# Altium footprint library ref-packages.PCBLIB: 1543 footprints (part 5 of 103)
Each footprint in its own frame and in the unit in brackets; x right, y up, seen from the top. Pads: shape width x height; smd on the part's side, far side on the other; paste and mask are expansions set on the pad; w line width, h text height; cw(c..) or ccw(c..) is an arc to the next point about the centre after c.
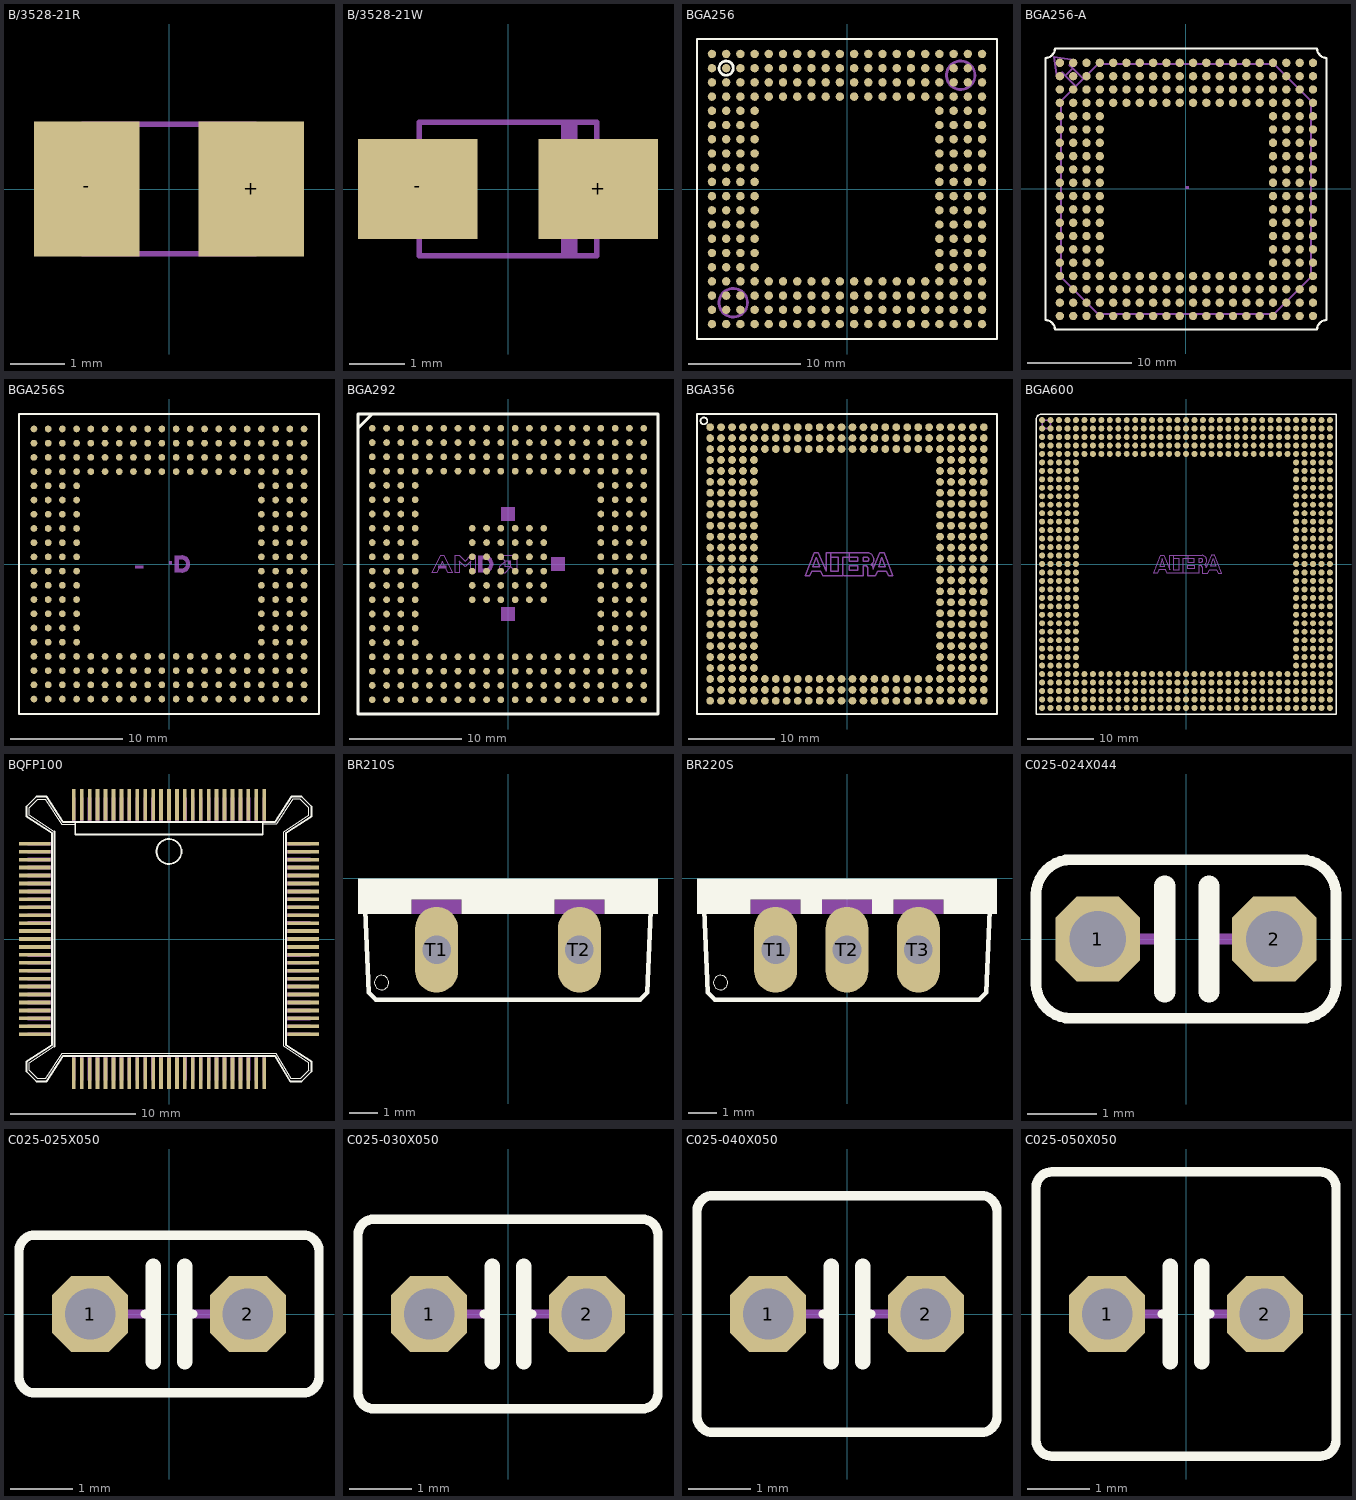
[diagram p4: the footprints below, top view; thin cyan lines are the x and y axes]

## B/3528-21R [mm]
pads (2):
  rect 1.95x2.5 smd: +(1.525,0) -(-1.525,0)
Mechanical 16:
  rectangle: -1.75,-0.6 -1.625,0.6
  rectangle: 1.625,-0.6 1.75,0.6
  rectangle: 0.95,-1.225 1.25,1.225
  lines w0.102: -1.6,-1.2 1.6,-1.2 1.6,1.2 -1.6,1.2 -1.6,-1.2

## B/3528-21W [mil]
pads (2):
  rect 84.65x70.87 smd: +(63.98,0) -(-63.98,0)
Mechanical 16:
  rectangle: -68.9,-23.62 -63.98,23.62
  rectangle: 63.98,-23.62 68.9,23.62
  rectangle: 37.4,-48.23 49.21,48.23
  lines w4: -62.99,-47.24 62.99,-47.24 62.99,47.24 -62.99,47.24 -62.99,-47.24

## BGA256 [mil]
pads (256):
  rrect100% 29.53x29.53 smd: A1(-475,475) A2(-425,475) A3(-375,475) A4(-325,475) A5(-275,475) A6(-225,475) A7(-175,475) A8(-125,475) A9(-75,475) A10(-25,475) A11(25,475) A12(75,475) A13(125,475) A14(175,475) A15(225,475) A16(275,475) A17(325,475) A18(375,475) A19(425,475) A20(475,475) B1(-475,425) B2(-425,425) B3(-375,425) B4(-325,425) B5(-275,425) B6(-225,425) B7(-175,425) B8(-125,425) B9(-75,425) B10(-25,425) B11(25,425) B12(75,425) B13(125,425) B14(175,425) B15(225,425) B16(275,425) B17(325,425) B18(375,425) B19(425,425) B20(475,425) C1(-475,375) C2(-425,375) C3(-375,375) C4(-325,375) C5(-275,375) C6(-225,375) C7(-175,375) C8(-125,375) C9(-75,375) C10(-25,375) C11(25,375) C12(75,375) C13(125,375) C14(175,375) C15(225,375) C16(275,375) C17(325,375) C18(375,375) C19(425,375) C20(475,375) D1(-475,325) D2(-425,325) D3(-375,325) D4(-325,325) D5(-275,325) D6(-225,325) D7(-175,325) D8(-125,325) D9(-75,325) D10(-25,325) D11(25,325) D12(75,325) D13(125,325) D14(175,325) D15(225,325) D16(275,325) D17(325,325) D18(375,325) D19(425,325) D20(475,325) E1(-475,275) E2(-425,275) E3(-375,275) E4(-325,275) E17(325,275) E18(375,275) E19(425,275) E20(475,275) F1(-475,225) F2(-425,225) F3(-375,225) F4(-325,225) F17(325,225) F18(375,225) F19(425,225) F20(475,225) G1(-475,175) G2(-425,175) G3(-375,175) G4(-325,175) G17(325,175) G18(375,175) G19(425,175) G20(475,175) H1(-475,125) H2(-425,125) H3(-375,125) H4(-325,125) H17(325,125) H18(375,125) H19(425,125) H20(475,125) J1(-475,75) J2(-425,75) J3(-375,75) J4(-325,75) J17(325,75) J18(375,75) J19(425,75) J20(475,75) K1(-475,25) K2(-425,25) K3(-375,25) K4(-325,25) K17(325,25) K18(375,25) K19(425,25) K20(475,25) L1(-475,-25) L2(-425,-25) L3(-375,-25) L4(-325,-25) L17(325,-25) L18(375,-25) L19(425,-25) L20(475,-25) M1(-475,-75) M2(-425,-75) M3(-375,-75) M4(-325,-75) M17(325,-75) M18(375,-75) M19(425,-75) M20(475,-75) N1(-475,-125) N2(-425,-125) N3(-375,-125) N4(-325,-125) N17(325,-125) N18(375,-125) N19(425,-125) N20(475,-125) P1(-475,-175) P2(-425,-175) P3(-375,-175) P4(-325,-175) P17(325,-175) P18(375,-175) P19(425,-175) P20(475,-175) R1(-475,-225) R2(-425,-225) R3(-375,-225) R4(-325,-225) R17(325,-225) R18(375,-225) R19(425,-225) R20(475,-225) T1(-475,-275) T2(-425,-275) T3(-375,-275) T4(-325,-275) T17(325,-275) T18(375,-275) T19(425,-275) T20(475,-275) U1(-475,-325) U2(-425,-325) U3(-375,-325) U4(-325,-325) U5(-275,-325) U6(-225,-325) U7(-175,-325) U8(-125,-325) U9(-75,-325) U10(-25,-325) U11(25,-325) U12(75,-325) U13(125,-325) U14(175,-325) U15(225,-325) U16(275,-325) U17(325,-325) U18(375,-325) U19(425,-325) U20(475,-325) V1(-475,-375) V2(-425,-375) V3(-375,-375) V4(-325,-375) V5(-275,-375) V6(-225,-375) V7(-175,-375) V8(-125,-375) V9(-75,-375) V10(-25,-375) V11(25,-375) V12(75,-375) V13(125,-375) V14(175,-375) V15(225,-375) V16(275,-375) V17(325,-375) V18(375,-375) V19(425,-375) V20(475,-375) W1(-475,-425) W2(-425,-425) W3(-375,-425) W4(-325,-425) W5(-275,-425) W6(-225,-425) W7(-175,-425) W8(-125,-425) W9(-75,-425) W10(-25,-425) W11(25,-425) W12(75,-425) W13(125,-425) W14(175,-425) W15(225,-425) W16(275,-425) W17(325,-425) W18(375,-425) W19(425,-425) W20(475,-425) Y1(-475,-475) Y2(-425,-475) Y3(-375,-475) Y4(-325,-475) Y5(-275,-475) Y6(-225,-475) Y7(-175,-475) Y8(-125,-475) Y9(-75,-475) Y10(-25,-475) Y11(25,-475) Y12(75,-475) Y13(125,-475) Y14(175,-475) Y15(225,-475) Y16(275,-475) Y17(325,-475) Y18(375,-475) Y19(425,-475) Y20(475,-475)
Top Overlay:
  circle w10: c-425,425 r25
  lines w8: -527.56,-527.13 -527.56,527.13 ; -527.13,-527.56 527.13,-527.56 ; -527.13,527.56 527.13,527.56 ; 527.56,-527.13 527.56,527.13
Mechanical 16:
  circle w10: c-400,-400 r50
  circle w10: c400,400 r50

## BGA256-A [mil]
pads (256):
  rrect100% 31.5x31.5 smd: A1(-473.43,473.43) A2(-423.43,473.43) A3(-373.43,473.43) A4(-323.43,473.43) A5(-273.43,473.43) A6(-223.43,473.43) A7(-173.43,473.43) A8(-123.43,473.43) A9(-73.43,473.43) A10(-23.43,473.43) A11(26.57,473.43) A12(76.57,473.43) A13(126.57,473.43) A14(176.57,473.43) A15(226.57,473.43) A16(276.57,473.43) A17(326.57,473.43) A18(376.57,473.43) A19(426.57,473.43) A20(476.57,473.43) B1(-473.43,423.43) B2(-423.43,423.43) B3(-373.43,423.43) B4(-323.43,423.43) B5(-273.43,423.43) B6(-223.43,423.43) B7(-173.43,423.43) B8(-123.43,423.43) B9(-73.43,423.43) B10(-23.43,423.43) B11(26.57,423.43) B12(76.57,423.43) B13(126.57,423.43) B14(176.57,423.43) B15(226.57,423.43) B16(276.57,423.43) B17(326.57,423.43) B18(376.57,423.43) B19(426.57,423.43) B20(476.57,423.43) C1(-473.43,373.43) C2(-423.43,373.43) C3(-373.43,373.43) C4(-323.43,373.43) C5(-273.43,373.43) C6(-223.43,373.43) C7(-173.43,373.43) C8(-123.43,373.43) C9(-73.43,373.43) C10(-23.43,373.43) C11(26.57,373.43) C12(76.57,373.43) C13(126.57,373.43) C14(176.57,373.43) C15(226.57,373.43) C16(276.57,373.43) C17(326.57,373.43) C18(376.57,373.43) C19(426.57,373.43) C20(476.57,373.43) D1(-473.43,323.43) D2(-423.43,323.43) D3(-373.43,323.43) D4(-323.43,323.43) D5(-273.43,323.43) D6(-223.43,323.43) D7(-173.43,323.43) D8(-123.43,323.43) D9(-73.43,323.43) D10(-23.43,323.43) D11(26.57,323.43) D12(76.57,323.43) D13(126.57,323.43) D14(176.57,323.43) D15(226.57,323.43) D16(276.57,323.43) D17(326.57,323.43) D18(376.57,323.43) D19(426.57,323.43) D20(476.57,323.43) E1(-473.43,273.43) E2(-423.43,273.43) E3(-373.43,273.43) E4(-323.43,273.43) E17(326.57,273.43) E18(376.57,273.43) E19(426.57,273.43) E20(476.57,273.43) F1(-473.43,223.43) F2(-423.43,223.43) F3(-373.43,223.43) F4(-323.43,223.43) F17(326.57,223.43) F18(376.57,223.43) F19(426.57,223.43) F20(476.57,223.43) G1(-473.43,173.43) G2(-423.43,173.43) G3(-373.43,173.43) G4(-323.43,173.43) G17(326.57,173.43) G18(376.57,173.43) G19(426.57,173.43) G20(476.57,173.43) H1(-473.43,123.43) H2(-423.43,123.43) H3(-373.43,123.43) H4(-323.43,123.43) H17(326.57,123.43) H18(376.57,123.43) H19(426.57,123.43) H20(476.57,123.43) J1(-473.43,73.43) J2(-423.43,73.43) J3(-373.43,73.43) J4(-323.43,73.43) J17(326.57,73.43) J18(376.57,73.43) J19(426.57,73.43) J20(476.57,73.43) K1(-473.43,23.43) K2(-423.43,23.43) K3(-373.43,23.43) K4(-323.43,23.43) K17(326.57,23.43) K18(376.57,23.43) K19(426.57,23.43) K20(476.57,23.43) L1(-473.43,-26.57) L2(-423.43,-26.57) L3(-373.43,-26.57) L4(-323.43,-26.57) L17(326.57,-26.57) L18(376.57,-26.57) L19(426.57,-26.57) L20(476.57,-26.57) M1(-473.43,-76.57) M2(-423.43,-76.57) M3(-373.43,-76.57) M4(-323.43,-76.57) M17(326.57,-76.57) M18(376.57,-76.57) M19(426.57,-76.57) M20(476.57,-76.57) N1(-473.43,-126.57) N2(-423.43,-126.57) N3(-373.43,-126.57) N4(-323.43,-126.57) N17(326.57,-126.57) N18(376.57,-126.57) N19(426.57,-126.57) N20(476.57,-126.57) P1(-473.43,-176.57) P2(-423.43,-176.57) P3(-373.43,-176.57) P4(-323.43,-176.57) P17(326.57,-176.57) P18(376.57,-176.57) P19(426.57,-176.57) P20(476.57,-176.57) R1(-473.43,-226.57) R2(-423.43,-226.57) R3(-373.43,-226.57) R4(-323.43,-226.57) R17(326.57,-226.57) R18(376.57,-226.57) R19(426.57,-226.57) R20(476.57,-226.57) T1(-473.43,-276.57) T2(-423.43,-276.57) T3(-373.43,-276.57) T4(-323.43,-276.57) T17(326.57,-276.57) T18(376.57,-276.57) T19(426.57,-276.57) T20(476.57,-276.57) U1(-473.43,-326.57) U2(-423.43,-326.57) U3(-373.43,-326.57) U4(-323.43,-326.57) U5(-273.43,-326.57) U6(-223.43,-326.57) U7(-173.43,-326.57) U8(-123.43,-326.57) U9(-73.43,-326.57) U10(-23.43,-326.57) U11(26.57,-326.57) U12(76.57,-326.57) U13(126.57,-326.57) U14(176.57,-326.57) U15(226.57,-326.57) U16(276.57,-326.57) U17(326.57,-326.57) U18(376.57,-326.57) U19(426.57,-326.57) U20(476.57,-326.57) V1(-473.43,-376.57) V2(-423.43,-376.57) V3(-373.43,-376.57) V4(-323.43,-376.57) V5(-273.43,-376.57) V6(-223.43,-376.57) V7(-173.43,-376.57) V8(-123.43,-376.57) V9(-73.43,-376.57) V10(-23.43,-376.57) V11(26.57,-376.57) V12(76.57,-376.57) V13(126.57,-376.57) V14(176.57,-376.57) V15(226.57,-376.57) V16(276.57,-376.57) V17(326.57,-376.57) V18(376.57,-376.57) V19(426.57,-376.57) V20(476.57,-376.57) W1(-473.43,-426.57) W2(-423.43,-426.57) W3(-373.43,-426.57) W4(-323.43,-426.57) W5(-273.43,-426.57) W6(-223.43,-426.57) W7(-173.43,-426.57) W8(-123.43,-426.57) W9(-73.43,-426.57) W10(-23.43,-426.57) W11(26.57,-426.57) W12(76.57,-426.57) W13(126.57,-426.57) W14(176.57,-426.57) W15(226.57,-426.57) W16(276.57,-426.57) W17(326.57,-426.57) W18(376.57,-426.57) W19(426.57,-426.57) W20(476.57,-426.57) Y1(-473.43,-476.57) Y2(-423.43,-476.57) Y3(-373.43,-476.57) Y4(-323.43,-476.57) Y5(-273.43,-476.57) Y6(-223.43,-476.57) Y7(-173.43,-476.57) Y8(-123.43,-476.57) Y9(-73.43,-476.57) Y10(-23.43,-476.57) Y11(26.57,-476.57) Y12(76.57,-476.57) Y13(126.57,-476.57) Y14(176.57,-476.57) Y15(226.57,-476.57) Y16(276.57,-476.57) Y17(326.57,-476.57) Y18(376.57,-476.57) Y19(426.57,-476.57) Y20(476.57,-476.57)
Top Overlay:
  lines w8: -527.56,-492.13 -527.56,492.13 ccw(c-527.56,527.56) -492.13,527.56 492.13,527.56 ccw(c527.56,527.56) 527.56,492.13 527.56,-492.13 ccw(c527.56,-527.56) 492.13,-527.56 -492.13,-527.56 ccw(c-527.56,-527.56) -527.56,-492.13
Mechanical 16:
  region: 0,0 10,0 10,10 0,10
  region: 0,0 10,0 10,10 0,10
  lines w8: -452.76,425.2 -464.57,437.01 -484.25,417.32 -496.06,496.06 -417.32,484.25 -437.01,464.57 -425.2,452.76 ; -452.76,425.2 -413.39,385.83 ; -452.76,425.2 -425.2,452.76 ; -425.2,452.76 -385.83,413.39 ; -413.39,385.83 -468.5,330.71 -468.5,-330.71 -330.71,-468.5 330.71,-468.5 468.5,-330.71 468.5,330.71 330.71,468.5 -330.71,468.5 -385.83,413.39 ; -413.39,385.83 -385.83,413.39

## BGA256S [mil]
pads (256):
  rrect100% 23.62x23.62 smd: A1(-475,475) A2(-425,475) A3(-375,475) A4(-325,475) A5(-275,475) A6(-225,475) A7(-175,475) A8(-125,475) A9(-75,475) A10(-25,475) A11(25,475) A12(75,475) A13(125,475) A14(175,475) A15(225,475) A16(275,475) A17(325,475) A18(375,475) A19(425,475) A20(475,475) B1(-475,425) B2(-425,425) B3(-375,425) B4(-325,425) B5(-275,425) B6(-225,425) B7(-175,425) B8(-125,425) B9(-75,425) B10(-25,425) B11(25,425) B12(75,425) B13(125,425) B14(175,425) B15(225,425) B16(275,425) B17(325,425) B18(375,425) B19(425,425) B20(475,425) C1(-475,375) C2(-425,375) C3(-375,375) C4(-325,375) C5(-275,375) C6(-225,375) C7(-175,375) C8(-125,375) C9(-75,375) C10(-25,375) C11(25,375) C12(75,375) C13(125,375) C14(175,375) C15(225,375) C16(275,375) C17(325,375) C18(375,375) C19(425,375) C20(475,375) D1(-475,325) D2(-425,325) D3(-375,325) D4(-325,325) D5(-275,325) D6(-225,325) D7(-175,325) D8(-125,325) D9(-75,325) D10(-25,325) D11(25,325) D12(75,325) D13(125,325) D14(175,325) D15(225,325) D16(275,325) D17(325,325) D18(375,325) D19(425,325) D20(475,325) E1(-475,275) E2(-425,275) E3(-375,275) E4(-325,275) E17(325,275) E18(375,275) E19(425,275) E20(475,275) F1(-475,225) F2(-425,225) F3(-375,225) F4(-325,225) F17(325,225) F18(375,225) F19(425,225) F20(475,225) G1(-475,175) G2(-425,175) G3(-375,175) G4(-325,175) G17(325,175) G18(375,175) G19(425,175) G20(475,175) H1(-475,125) H2(-425,125) H3(-375,125) H4(-325,125) H17(325,125) H18(375,125) H19(425,125) H20(475,125) J1(-475,75) J2(-425,75) J3(-375,75) J4(-325,75) J17(325,75) J18(375,75) J19(425,75) J20(475,75) K1(-475,25) K2(-425,25) K3(-375,25) K4(-325,25) K17(325,25) K18(375,25) K19(425,25) K20(475,25) L1(-475,-25) L2(-425,-25) L3(-375,-25) L4(-325,-25) L17(325,-25) L18(375,-25) L19(425,-25) L20(475,-25) M1(-475,-75) M2(-425,-75) M3(-375,-75) M4(-325,-75) M17(325,-75) M18(375,-75) M19(425,-75) M20(475,-75) N1(-475,-125) N2(-425,-125) N3(-375,-125) N4(-325,-125) N17(325,-125) N18(375,-125) N19(425,-125) N20(475,-125) P1(-475,-175) P2(-425,-175) P3(-375,-175) P4(-325,-175) P17(325,-175) P18(375,-175) P19(425,-175) P20(475,-175) R1(-475,-225) R2(-425,-225) R3(-375,-225) R4(-325,-225) R17(325,-225) R18(375,-225) R19(425,-225) R20(475,-225) T1(-475,-275) T2(-425,-275) T3(-375,-275) T4(-325,-275) T17(325,-275) T18(375,-275) T19(425,-275) T20(475,-275) U1(-475,-325) U2(-425,-325) U3(-375,-325) U4(-325,-325) U5(-275,-325) U6(-225,-325) U7(-175,-325) U8(-125,-325) U9(-75,-325) U10(-25,-325) U11(25,-325) U12(75,-325) U13(125,-325) U14(175,-325) U15(225,-325) U16(275,-325) U17(325,-325) U18(375,-325) U19(425,-325) U20(475,-325) V1(-475,-375) V2(-425,-375) V3(-375,-375) V4(-325,-375) V5(-275,-375) V6(-225,-375) V7(-175,-375) V8(-125,-375) V9(-75,-375) V10(-25,-375) V11(25,-375) V12(75,-375) V13(125,-375) V14(175,-375) V15(225,-375) V16(275,-375) V17(325,-375) V18(375,-375) V19(425,-375) V20(475,-375) W1(-475,-425) W2(-425,-425) W3(-375,-425) W4(-325,-425) W5(-275,-425) W6(-225,-425) W7(-175,-425) W8(-125,-425) W9(-75,-425) W10(-25,-425) W11(25,-425) W12(75,-425) W13(125,-425) W14(175,-425) W15(225,-425) W16(275,-425) W17(325,-425) W18(375,-425) W19(425,-425) W20(475,-425) Y1(-475,-475) Y2(-425,-475) Y3(-375,-475) Y4(-325,-475) Y5(-275,-475) Y6(-225,-475) Y7(-175,-475) Y8(-125,-475) Y9(-75,-475) Y10(-25,-475) Y11(25,-475) Y12(75,-475) Y13(125,-475) Y14(175,-475) Y15(225,-475) Y16(275,-475) Y17(325,-475) Y18(375,-475) Y19(425,-475) Y20(475,-475)
Top Overlay:
  lines w8: -527.56,-527.13 -527.56,527.13 ; -527.13,-527.56 527.13,-527.56 ; -527.13,527.56 527.13,527.56 ; 527.56,-527.13 527.56,527.13
Mechanical 16:
  rectangle: 23,16 45,30
  rectangle: 23,-30 45,-16
  rectangle: -120,-15 -90,-5
  rectangle: 20,-30 35,30
  region: 0,0 10,0 10,10 0,10
  region: 0,0 10,0 10,10 0,10
  region: 0,0 10,0 10,10 0,10
  region: 0,0 10,0 10,10 0,10
  region: 0,0 10,0 10,10 0,10
  lines w2: 44,-29 ccw(c44,0) 44,29
  lines w8: 44,-25 ccw(c44,0) 44,25
  lines w10: 44,-21 ccw(c44,0) 44,21
  text "BGA256" at -185.63,-103.74 h49.6

## BGA292 [mil]
pads (292):
  rrect100% 23.62x23.62 smd: A01(-475,475) A02(-425,475) A03(-375,475) A04(-325,475) A05(-275,475) A06(-225,475) A07(-175,475) A08(-125,475) A09(-75,475) A10(-25,475) A11(25,475) A12(75,475) A13(125,475) A14(175,475) A15(225,475) A16(275,475) A17(325,475) A18(375,475) A19(425,475) A20(475,475) B01(-475,425) B02(-425,425) B03(-375,425) B04(-325,425) B05(-275,425) B06(-225,425) B07(-175,425) B08(-125,425) B09(-75,425) B10(-25,425) B11(25,425) B12(75,425) B13(125,425) B14(175,425) B15(225,425) B16(275,425) B17(325,425) B18(375,425) B19(425,425) B20(475,425) C01(-475,375) C02(-425,375) C03(-375,375) C04(-325,375) C05(-275,375) C06(-225,375) C07(-175,375) C08(-125,375) C09(-75,375) C10(-25,375) C11(25,375) C12(75,375) C13(125,375) C14(175,375) C15(225,375) C16(275,375) C17(325,375) C18(375,375) C19(425,375) C20(475,375) D01(-475,325) D02(-425,325) D03(-375,325) D04(-325,325) D05(-275,325) D06(-225,325) D07(-175,325) D08(-125,325) D09(-75,325) D10(-25,325) D11(25,325) D12(75,325) D13(125,325) D14(175,325) D15(225,325) D16(275,325) D17(325,325) D18(375,325) D19(425,325) D20(475,325) E01(-475,275) E02(-425,275) E03(-375,275) E04(-325,275) E17(325,275) E18(375,275) E19(425,275) E20(475,275) F01(-475,225) F02(-425,225) F03(-375,225) F04(-325,225) F17(325,225) F18(375,225) F19(425,225) F20(475,225) G01(-475,175) G02(-425,175) G03(-375,175) G04(-325,175) G17(325,175) G18(375,175) G19(425,175) G20(475,175) H01(-475,125) H02(-425,125) H03(-375,125) H04(-325,125) H08(-125,125) H09(-75,125) H10(-25,125) H11(25,125) H12(75,125) H13(125,125) H17(325,125) H18(375,125) H19(425,125) H20(475,125) J01(-475,75) J02(-425,75) J03(-375,75) J04(-325,75) J08(-125,75) J09(-75,75) J10(-25,75) J11(25,75) J12(75,75) J13(125,75) J17(325,75) J18(375,75) J19(425,75) J20(475,75) K01(-475,25) K02(-425,25) K03(-375,25) K04(-325,25) K08(-125,25) K09(-75,25) K10(-25,25) K11(25,25) K12(75,25) K13(125,25) K17(325,25) K18(375,25) K19(425,25) K20(475,25) L01(-475,-25) L02(-425,-25) L03(-375,-25) L04(-325,-25) L08(-125,-25) L09(-75,-25) L10(-25,-25) L11(25,-25) L12(75,-25) L13(125,-25) L17(325,-25) L18(375,-25) L19(425,-25) L20(475,-25) M01(-475,-75) M02(-425,-75) M03(-375,-75) M04(-325,-75) M08(-125,-75) M09(-75,-75) M10(-25,-75) M11(25,-75) M12(75,-75) M13(125,-75) M17(325,-75) M18(375,-75) M19(425,-75) M20(475,-75) N01(-475,-125) N02(-425,-125) N03(-375,-125) N04(-325,-125) N08(-125,-125) N09(-75,-125) N10(-25,-125) N11(25,-125) N12(75,-125) N13(125,-125) N17(325,-125) N18(375,-125) N19(425,-125) N20(475,-125) P01(-475,-175) P02(-425,-175) P03(-375,-175) P04(-325,-175) P17(325,-175) P18(375,-175) P19(425,-175) P20(475,-175) R01(-475,-225) R02(-425,-225) R03(-375,-225) R04(-325,-225) R17(325,-225) R18(375,-225) R19(425,-225) R20(475,-225) T01(-475,-275) T02(-425,-275) T03(-375,-275) T04(-325,-275) T17(325,-275) T18(375,-275) T19(425,-275) T20(475,-275) U01(-475,-325) U02(-425,-325) U03(-375,-325) U04(-325,-325) U05(-275,-325) U06(-225,-325) U07(-175,-325) U08(-125,-325) U09(-75,-325) U10(-25,-325) U11(25,-325) U12(75,-325) U13(125,-325) U14(175,-325) U15(225,-325) U16(275,-325) U17(325,-325) U18(375,-325) U19(425,-325) U20(475,-325) V01(-475,-375) V02(-425,-375) V03(-375,-375) V04(-325,-375) V05(-275,-375) V06(-225,-375) V07(-175,-375) V08(-125,-375) V09(-75,-375) V10(-25,-375) V11(25,-375) V12(75,-375) V13(125,-375) V14(175,-375) V15(225,-375) V16(275,-375) V17(325,-375) V18(375,-375) V19(425,-375) V20(475,-375) W01(-475,-425) W02(-425,-425) W03(-375,-425) W04(-325,-425) W05(-275,-425) W06(-225,-425) W07(-175,-425) W08(-125,-425) W09(-75,-425) W10(-25,-425) W11(25,-425) W12(75,-425) W13(125,-425) W14(175,-425) W15(225,-425) W16(275,-425) W17(325,-425) W18(375,-425) W19(425,-425) W20(475,-425) Y01(-475,-475) Y02(-425,-475) Y03(-375,-475) Y04(-325,-475) Y05(-275,-475) Y06(-225,-475) Y07(-175,-475) Y08(-125,-475) Y09(-75,-475) Y10(-25,-475) Y11(25,-475) Y12(75,-475) Y13(125,-475) Y14(175,-475) Y15(225,-475) Y16(275,-475) Y17(325,-475) Y18(375,-475) Y19(425,-475) Y20(475,-475)
Top Overlay:
  lines w10: -525,475 -525,-525 525,-525 525,525 -475,525 ; -525,475 -525,525 -475,525 ; -525,475 -475,525
Mechanical 16:
  rectangle: -25,150 25,200
  rectangle: -25,-200 25,-150
  rectangle: 150,-25 200,25
  rectangle: -102,16 -80,30
  rectangle: -102,-30 -80,-16
  rectangle: -245,-15 -215,-5
  rectangle: -105,-30 -90,30
  region: 0,0 10,0 10,10 0,10
  region: 0,0 10,0 10,10 0,10
  region: 0,0 10,0 10,10 0,10
  region: 0,0 10,0 10,10 0,10
  lines w2: -81,-29 ccw(c-81,0) -81,29 ; -10,10 10,10 10,-10 ; -10,10 -30,30 30,30 30,-30 10,-10 ; -10,10 -30,-10 -30,-30 -10,-30 10,-10 ; -10,10 -10,-10 10,-10 ; -265,-30 -235,30 -225,30 -195,-30 -210,-30 -230,10 -250,-30 -265,-30 ; -185,-30 -185,30 -170,30 -150,10 -130,30 -115,30 -115,-30 -130,-30 -130,10 -150,-10 -170,10 -170,-30 -185,-30
  lines w8: -81,-25 ccw(c-81,0) -81,25
  lines w10: -81,-21 ccw(c-81,0) -81,21
  text "1" at -475,500 h24.8
  text "2" at -425,500 h24.8
  text "3" at -375,500 h24.8
  text "4" at -325,500 h24.8
  text "5" at -275,500 h24.8
  text "6" at -225,500 h24.8
  text "7" at -175,500 h24.8
  text "8" at -125,500 h24.8
  text "9" at -75,500 h24.8
  text "10" at -25,500 h24.8
  text "11" at 25,500 h24.8
  text "12" at 75,500 h24.8
  text "13" at 125,500 h24.8
  text "14" at 175,500 h24.8
  text "15" at 225,500 h24.8
  text "16" at 275,500 h24.8
  text "17" at 325,500 h24.8
  text "18" at 375,500 h24.8
  text "19" at 425,500 h24.8
  text "20" at 475,500 h24.8
  text "A" at -510,470 h24.8
  text "B" at -510,420 h24.8
  text "C" at -510,370 h24.8
  text "D" at -510,320 h24.8
  text "E" at -510,270 h24.8
  text "F" at -510,220 h24.8
  text "G" at -510,170 h24.8
  text "H" at -510,120 h24.8
  text "J" at -510,70 h24.8
  text "K" at -510,20 h24.8
  text "L" at -510,-30 h24.8
  text "M" at -510,-80 h24.8
  text "N" at -510,-130 h24.8
  text "P" at -510,-180 h24.8
  text "R" at -510,-230 h24.8
  text "T" at -510,-280 h24.8
  text "U" at -510,-330 h24.8
  text "V" at -510,-380 h24.8
  text "W" at -510,-430 h24.8
  text "Y" at -510,-480 h24.8

## BGA356 [mil]
pads (356):
  rrect100% 35.43x35.43 smd: A1(-625,625) A2(-575,625) A3(-525,625) A4(-475,625) A5(-425,625) A6(-375,625) A7(-325,625) A8(-275,625) A9(-225,625) A10(-175,625) A11(-125,625) A12(-75,625) A13(-25,625) A14(25,625) A15(75,625) A16(125,625) A17(175,625) A18(225,625) A19(275,625) A20(325,625) A21(375,625) A22(425,625) A23(475,625) A24(525,625) A25(575,625) A26(625,625) AA1(-625,-375) AA2(-575,-375) AA3(-525,-375) AA4(-475,-375) AA5(-425,-375) AA22(425,-375) AA23(475,-375) AA24(525,-375) AA25(575,-375) AA26(625,-375) AB1(-625,-425) AB2(-575,-425) AB3(-525,-425) AB4(-475,-425) AB5(-425,-425) AB22(425,-425) AB23(475,-425) AB24(525,-425) AB25(575,-425) AB26(625,-425) AC1(-625,-475) AC2(-575,-475) AC3(-525,-475) AC4(-475,-475) AC5(-425,-475) AC22(425,-475) AC23(475,-475) AC24(525,-475) AC25(575,-475) AC26(625,-475) AD1(-625,-525) AD2(-575,-525) AD3(-525,-525) AD4(-475,-525) AD5(-425,-525) AD6(-375,-525) AD7(-325,-525) AD8(-275,-525) AD9(-225,-525) AD10(-175,-525) AD11(-125,-525) AD12(-75,-525) AD13(-25,-525) AD14(25,-525) AD15(75,-525) AD16(125,-525) AD17(175,-525) AD18(225,-525) AD19(275,-525) AD20(325,-525) AD21(375,-525) AD22(425,-525) AD23(475,-525) AD24(525,-525) AD25(575,-525) AD26(625,-525) AE1(-625,-575) AE2(-575,-575) AE3(-525,-575) AE4(-475,-575) AE5(-425,-575) AE6(-375,-575) AE7(-325,-575) AE8(-275,-575) AE9(-225,-575) AE10(-175,-575) AE11(-125,-575) AE12(-75,-575) AE13(-25,-575) AE14(25,-575) AE15(75,-575) AE16(125,-575) AE17(175,-575) AE18(225,-575) AE19(275,-575) AE20(325,-575) AE21(375,-575) AE22(425,-575) AE23(475,-575) AE24(525,-575) AE25(575,-575) AE26(625,-575) AF1(-625,-625) AF2(-575,-625) AF3(-525,-625) AF4(-475,-625) AF5(-425,-625) AF6(-375,-625) AF7(-325,-625) AF8(-275,-625) AF9(-225,-625) AF10(-175,-625) AF11(-125,-625) AF12(-75,-625) AF13(-25,-625) AF14(25,-625) AF15(75,-625) AF16(125,-625) AF17(175,-625) AF18(225,-625) AF19(275,-625) AF20(325,-625) AF21(375,-625) AF22(425,-625) AF23(475,-625) AF24(525,-625) AF25(575,-625) AF26(625,-625) B1(-625,575) B2(-575,575) B3(-525,575) B4(-475,575) B5(-425,575) B6(-375,575) B7(-325,575) B8(-275,575) B9(-225,575) B10(-175,575) B11(-125,575) B12(-75,575) B13(-25,575) B14(25,575) B15(75,575) B16(125,575) B17(175,575) B18(225,575) B19(275,575) B20(325,575) B21(375,575) B22(425,575) B23(475,575) B24(525,575) B25(575,575) B26(625,575) C1(-625,525) C2(-575,525) C3(-525,525) C4(-475,525) C5(-425,525) C6(-375,525) C7(-325,525) C8(-275,525) C9(-225,525) C10(-175,525) C11(-125,525) C12(-75,525) C13(-25,525) C14(25,525) C15(75,525) C16(125,525) C17(175,525) C18(225,525) C19(275,525) C20(325,525) C21(375,525) C22(425,525) C23(475,525) C24(525,525) C25(575,525) C26(625,525) D1(-625,475) D2(-575,475) D3(-525,475) D4(-475,475) D5(-425,475) D22(425,475) D23(475,475) D24(525,475) D25(575,475) D26(625,475) E1(-625,425) E2(-575,425) E3(-525,425) E4(-475,425) E5(-425,425) E22(425,425) E23(475,425) E24(525,425) E25(575,425) E26(625,425) F1(-625,375) F2(-575,375) F3(-525,375) F4(-475,375) F5(-425,375) F22(425,375) F23(475,375) F24(525,375) F25(575,375) F26(625,375) G1(-625,325) G2(-575,325) G3(-525,325) G4(-475,325) G5(-425,325) G22(425,325) G23(475,325) G24(525,325) G25(575,325) G26(625,325) H1(-625,275) H2(-575,275) H3(-525,275) H4(-475,275) H5(-425,275) H22(425,275) H23(475,275) H24(525,275) H25(575,275) H26(625,275) J1(-625,225) J2(-575,225) J3(-525,225) J4(-475,225) J5(-425,225) J22(425,225) J23(475,225) J24(525,225) J25(575,225) J26(625,225) K1(-625,175) K2(-575,175) K3(-525,175) K4(-475,175) K5(-425,175) K22(425,175) K23(475,175) K24(525,175) K25(575,175) K26(625,175) L1(-625,125) L2(-575,125) L3(-525,125) L4(-475,125) L5(-425,125) L22(425,125) L23(475,125) L24(525,125) L25(575,125) L26(625,125) M1(-625,75) M2(-575,75) M3(-525,75) M4(-475,75) M5(-425,75) M22(425,75) M23(475,75) M24(525,75) M25(575,75) M26(625,75) N1(-625,25) N2(-575,25) N3(-525,25) N4(-475,25) N5(-425,25) N22(425,25) N23(475,25) N24(525,25) N25(575,25) N26(625,25) P1(-625,-25) P2(-575,-25) P3(-525,-25) P4(-475,-25) P5(-425,-25) P22(425,-25) P23(475,-25) P24(525,-25) P25(575,-25) P26(625,-25) R1(-625,-75) R2(-575,-75) R3(-525,-75) R4(-475,-75) R5(-425,-75) R22(425,-75) R23(475,-75) R24(525,-75) R25(575,-75) R26(625,-75) T1(-625,-125) T2(-575,-125) T3(-525,-125) T4(-475,-125) T5(-425,-125) T22(425,-125) T23(475,-125) T24(525,-125) T25(575,-125) T26(625,-125) U1(-625,-175) U2(-575,-175) U3(-525,-175) U4(-475,-175) U5(-425,-175) U22(425,-175) U23(475,-175) U24(525,-175) U25(575,-175) U26(625,-175) V1(-625,-225) V2(-575,-225) V3(-525,-225) V4(-475,-225) V5(-425,-225) V22(425,-225) V23(475,-225) V24(525,-225) V25(575,-225) V26(625,-225) W1(-625,-275) W2(-575,-275) W3(-525,-275) W4(-475,-275) W5(-425,-275) W22(425,-275) W23(475,-275) W24(525,-275) W25(575,-275) W26(625,-275) Y1(-625,-325) Y2(-575,-325) Y3(-525,-325) Y4(-475,-325) Y5(-425,-325) Y22(425,-325) Y23(475,-325) Y24(525,-325) Y25(575,-325) Y26(625,-325)
Top Overlay:
  circle w8: c-653.54,653.54 r15.74
  lines w8: -685.04,-685.04 -685.04,685.04 685.04,685.04 685.04,-685.04 -685.04,-685.04
Mechanical 16:
  lines w6: -15.32,-53.43 74.69,-53.43 74.69,-8.43 84.69,-8.43 cw(c84.69,-18.43) 94.69,-18.43 94.69,-53.43 129.69,-53.43 139.69,-33.43 179.69,-33.43 189.69,-53.43 209.69,-53.43 169.69,51.57 149.69,51.57 119.69,-18.43 ; 119.68,-23.43 ccw(c102.19,-19.67) 109.69,-3.43 ccw(c92.19,21.34) 94.69,51.57 9.69,51.57 ; -75.32,31.57 -75.32,51.57 ; -75.32,31.57 -75.32,-33.43 -40.32,-33.43 -40.32,31.57 -75.32,31.57 ; -75.32,51.57 -95.32,51.57 -95.32,-33.43 -130.32,51.57 -150.32,51.57 -190.32,-53.43 -170.32,-53.43 -160.32,-33.43 -120.32,-33.43 -110.32,-53.43 -20.32,-53.43 -20.32,31.57 9.69,31.57 ; -75.32,51.57 9.69,51.57 ; 9.69,31.57 9.69,51.57 ; 9.69,31.57 9.69,11.57 49.69,11.57 49.69,31.57 9.69,31.57 ; -155.32,-13.43 -140.32,31.57 -125.32,-13.43 -155.32,-13.43 ; 9.69,-28.43 49.69,-28.43 49.69,-8.43 9.69,-8.43 9.69,-28.43 ; 74.69,11.57 74.69,31.57 89.69,31.57 cw(c89.69,21.57) 89.69,11.57 74.69,11.57 ; 144.69,-13.43 174.69,-13.43 159.69,31.57 144.69,-13.43
  text "BGA356" at -35.63,-403.74 h49.6

## BGA600 [mil]
pads (600):
  rrect100% 35.43x35.43 smd: A1(-850,850) A2(-800,850) A3(-750,850) A4(-700,850) A5(-650,850) A6(-600,850) A7(-550,850) A8(-500,850) A9(-450,850) A10(-400,850) A11(-350,850) A12(-300,850) A13(-250,850) A14(-200,850) A15(-150,850) A16(-100,850) A17(-50,850) A18(0,850) A19(50,850) A20(100,850) A21(150,850) A22(200,850) A23(250,850) A24(300,850) A25(350,850) A26(400,850) A27(450,850) A28(500,850) A29(550,850) A30(600,850) A31(650,850) A32(700,850) A33(750,850) A34(800,850) A35(850,850) AA1(-850,-150) AA2(-800,-150) AA3(-750,-150) AA4(-700,-150) AA5(-650,-150) AA31(650,-150) AA32(700,-150) AA33(750,-150) AA34(800,-150) AA35(850,-150) AB1(-850,-200) AB2(-800,-200) AB3(-750,-200) AB4(-700,-200) AB5(-650,-200) AB31(650,-200) AB32(700,-200) AB33(750,-200) AB34(800,-200) AB35(850,-200) AC1(-850,-250) AC2(-800,-250) AC3(-750,-250) AC4(-700,-250) AC5(-650,-250) AC31(650,-250) AC32(700,-250) AC33(750,-250) AC34(800,-250) AC35(850,-250) AD1(-850,-300) AD2(-800,-300) AD3(-750,-300) AD4(-700,-300) AD5(-650,-300) AD31(650,-300) AD32(700,-300) AD33(750,-300) AD34(800,-300) AD35(850,-300) AE1(-850,-350) AE2(-800,-350) AE3(-750,-350) AE4(-700,-350) AE5(-650,-350) AE31(650,-350) AE32(700,-350) AE33(750,-350) AE34(800,-350) AE35(850,-350) AF1(-850,-400) AF2(-800,-400) AF3(-750,-400) AF4(-700,-400) AF5(-650,-400) AF31(650,-400) AF32(700,-400) AF33(750,-400) AF34(800,-400) AF35(850,-400) AG1(-850,-450) AG2(-800,-450) AG3(-750,-450) AG4(-700,-450) AG5(-650,-450) AG31(650,-450) AG32(700,-450) AG33(750,-450) AG34(800,-450) AG35(850,-450) AH1(-850,-500) AH2(-800,-500) AH3(-750,-500) AH4(-700,-500) AH5(-650,-500) AH31(650,-500) AH32(700,-500) AH33(750,-500) AH34(800,-500) AH35(850,-500) AJ1(-850,-550) AJ2(-800,-550) AJ3(-750,-550) AJ4(-700,-550) AJ5(-650,-550) AJ31(650,-550) AJ32(700,-550) AJ33(750,-550) AJ34(800,-550) AJ35(850,-550) AK1(-850,-600) AK2(-800,-600) AK3(-750,-600) AK4(-700,-600) AK5(-650,-600) AK31(650,-600) AK32(700,-600) AK33(750,-600) AK34(800,-600) AK35(850,-600) AL1(-850,-650) AL2(-800,-650) AL3(-750,-650) AL4(-700,-650) AL5(-650,-650) AL6(-600,-650) AL7(-550,-650) AL8(-500,-650) AL9(-450,-650) AL10(-400,-650) AL11(-350,-650) AL12(-300,-650) AL13(-250,-650) AL14(-200,-650) AL15(-150,-650) AL16(-100,-650) AL17(-50,-650) AL18(0,-650) AL19(50,-650) AL20(100,-650) AL21(150,-650) AL22(200,-650) AL23(250,-650) AL24(300,-650) AL25(350,-650) AL26(400,-650) AL27(450,-650) AL28(500,-650) AL29(550,-650) AL30(600,-650) AL31(650,-650) AL32(700,-650) AL33(750,-650) AL34(800,-650) AL35(850,-650) AM1(-850,-700) AM2(-800,-700) AM3(-750,-700) AM4(-700,-700) AM5(-650,-700) AM6(-600,-700) AM7(-550,-700) AM8(-500,-700) AM9(-450,-700) AM10(-400,-700) AM11(-350,-700) AM12(-300,-700) AM13(-250,-700) AM14(-200,-700) AM15(-150,-700) AM16(-100,-700) AM17(-50,-700) AM18(0,-700) AM19(50,-700) AM20(100,-700) AM21(150,-700) AM22(200,-700) AM23(250,-700) AM24(300,-700) AM25(350,-700) AM26(400,-700) AM27(450,-700) AM28(500,-700) AM29(550,-700) AM30(600,-700) AM31(650,-700) AM32(700,-700) AM33(750,-700) AM34(800,-700) AM35(850,-700) AN1(-850,-750) AN2(-800,-750) AN3(-750,-750) AN4(-700,-750) AN5(-650,-750) AN6(-600,-750) AN7(-550,-750) AN8(-500,-750) AN9(-450,-750) AN10(-400,-750) AN11(-350,-750) AN12(-300,-750) AN13(-250,-750) AN14(-200,-750) AN15(-150,-750) AN16(-100,-750) AN17(-50,-750) AN18(0,-750) AN19(50,-750) AN20(100,-750) AN21(150,-750) AN22(200,-750) AN23(250,-750) AN24(300,-750) AN25(350,-750) AN26(400,-750) AN27(450,-750) AN28(500,-750) AN29(550,-750) AN30(600,-750) AN31(650,-750) AN32(700,-750) AN33(750,-750) AN34(800,-750) AN35(850,-750) AP1(-850,-800) AP2(-800,-800) AP3(-750,-800) AP4(-700,-800) AP5(-650,-800) AP6(-600,-800) AP7(-550,-800) AP8(-500,-800) AP9(-450,-800) AP10(-400,-800) AP11(-350,-800) AP12(-300,-800) AP13(-250,-800) AP14(-200,-800) AP15(-150,-800) AP16(-100,-800) AP17(-50,-800) AP18(0,-800) AP19(50,-800) AP20(100,-800) AP21(150,-800) AP22(200,-800) AP23(250,-800) AP24(300,-800) AP25(350,-800) AP26(400,-800) AP27(450,-800) AP28(500,-800) AP29(550,-800) AP30(600,-800) AP31(650,-800) AP32(700,-800) AP33(750,-800) AP34(800,-800) AP35(850,-800) AR1(-850,-850) AR2(-800,-850) AR3(-750,-850) AR4(-700,-850) AR5(-650,-850) AR6(-600,-850) AR7(-550,-850) AR8(-500,-850) AR9(-450,-850) AR10(-400,-850) AR11(-350,-850) AR12(-300,-850) AR13(-250,-850) AR14(-200,-850) AR15(-150,-850) AR16(-100,-850) AR17(-50,-850) AR18(0,-850) AR19(50,-850) AR20(100,-850) AR21(150,-850) AR22(200,-850) AR23(250,-850) AR24(300,-850) AR25(350,-850) AR26(400,-850) AR27(450,-850) AR28(500,-850) AR29(550,-850) AR30(600,-850) AR31(650,-850) AR32(700,-850) AR33(750,-850) AR34(800,-850) AR35(850,-850) B1(-850,800) B2(-800,800) B3(-750,800) B4(-700,800) B5(-650,800) B6(-600,800) B7(-550,800) B8(-500,800) B9(-450,800) B10(-400,800) B11(-350,800) B12(-300,800) B13(-250,800) B14(-200,800) B15(-150,800) B16(-100,800) B17(-50,800) B18(0,800) B19(50,800) B20(100,800) B21(150,800) B22(200,800) B23(250,800) B24(300,800) B25(350,800) B26(400,800) B27(450,800) B28(500,800) B29(550,800) B30(600,800) B31(650,800) B32(700,800) B33(750,800) B34(800,800) B35(850,800) C1(-850,750) C2(-800,750) C3(-750,750) C4(-700,750) C5(-650,750) C6(-600,750) C7(-550,750) C8(-500,750) C9(-450,750) C10(-400,750) C11(-350,750) C12(-300,750) C13(-250,750) C14(-200,750) C15(-150,750) C16(-100,750) C17(-50,750) C18(0,750) C19(50,750) C20(100,750) C21(150,750) C22(200,750) C23(250,750) C24(300,750) C25(350,750) C26(400,750) C27(450,750) C28(500,750) C29(550,750) C30(600,750) C31(650,750) C32(700,750) C33(750,750) C34(800,750) C35(850,750) D1(-850,700) D2(-800,700) D3(-750,700) D4(-700,700) D5(-650,700) D6(-600,700) D7(-550,700) D8(-500,700) D9(-450,700) D10(-400,700) D11(-350,700) D12(-300,700) D13(-250,700) D14(-200,700) D15(-150,700) D16(-100,700) D17(-50,700) D18(0,700) D19(50,700) D20(100,700) D21(150,700) D22(200,700) D23(250,700) D24(300,700) D25(350,700) D26(400,700) D27(450,700) D28(500,700) D29(550,700) D30(600,700) D31(650,700) D32(700,700) D33(750,700) D34(800,700) D35(850,700) E1(-850,650) E2(-800,650) E3(-750,650) E4(-700,650) E5(-650,650) E6(-600,650) E7(-550,650) E8(-500,650) E9(-450,650) E10(-400,650) E11(-350,650) E12(-300,650) E13(-250,650) E14(-200,650) E15(-150,650) E16(-100,650) E17(-50,650) E18(0,650) E19(50,650) E20(100,650) E21(150,650) E22(200,650) E23(250,650) E24(300,650) E25(350,650) E26(400,650) E27(450,650) E28(500,650) E29(550,650) E30(600,650) E31(650,650) E32(700,650) E33(750,650) E34(800,650) E35(850,650) F1(-850,600) F2(-800,600) F3(-750,600) F4(-700,600) F5(-650,600) F31(650,600) F32(700,600) F33(750,600) F34(800,600) F35(850,600) G1(-850,550) G2(-800,550) G3(-750,550) G4(-700,550) G5(-650,550) G31(650,550) G32(700,550) G33(750,550) G34(800,550) G35(850,550) H1(-850,500) H2(-800,500) H3(-750,500) H4(-700,500) H5(-650,500) H31(650,500) H32(700,500) H33(750,500) H34(800,500) H35(850,500) J1(-850,450) J2(-800,450) J3(-750,450) J4(-700,450) J5(-650,450) J31(650,450) J32(700,450) J33(750,450) J34(800,450) J35(850,450) K1(-850,400) K2(-800,400) K3(-750,400) K4(-700,400) K5(-650,400) K31(650,400) K32(700,400) K33(750,400) K34(800,400) K35(850,400) L1(-850,350) L2(-800,350) L3(-750,350) L4(-700,350) L5(-650,350) L31(650,350) L32(700,350) L33(750,350) L34(800,350) L35(850,350) M1(-850,300) M2(-800,300) M3(-750,300) M4(-700,300) M5(-650,300) M31(650,300) M32(700,300) M33(750,300) M34(800,300) M35(850,300) N1(-850,250) N2(-800,250) N3(-750,250) N4(-700,250) N5(-650,250) N31(650,250) N32(700,250) N33(750,250) N34(800,250) N35(850,250) P1(-850,200) P2(-800,200) P3(-750,200) P4(-700,200) P5(-650,200) P31(650,200) P32(700,200) P33(750,200) P34(800,200) P35(850,200) R1(-850,150) R2(-800,150) R3(-750,150) R4(-700,150) R5(-650,150) R31(650,150) R32(700,150) R33(750,150) R34(800,150) R35(850,150) T1(-850,100) T2(-800,100) T3(-750,100) T4(-700,100) T5(-650,100) T31(650,100) T32(700,100) T33(750,100) T34(800,100) T35(850,100) U1(-850,50) U2(-800,50) U3(-750,50) U4(-700,50) U5(-650,50) U31(650,50) U32(700,50) U33(750,50) U34(800,50) U35(850,50) V1(-850,0) V2(-800,0) V3(-750,0) V4(-700,0) V5(-650,0) V31(650,0) V32(700,0) V33(750,0) V34(800,0) V35(850,0) W1(-850,-50) W2(-800,-50) W3(-750,-50) W4(-700,-50) W5(-650,-50) W31(650,-50) W32(700,-50) W33(750,-50) W34(800,-50) W35(850,-50) Y1(-850,-100) Y2(-800,-100) Y3(-750,-100) Y4(-700,-100) Y5(-650,-100) Y31(650,-100) Y32(700,-100) Y33(750,-100) Y34(800,-100) Y35(850,-100)
Top Overlay:
  lines w8: -885.83,-885.83 885.83,-885.83 885.83,885.83 -850.39,885.83 ccw(c-850.39,850.39) -885.83,850.39 -885.83,-885.83
Mechanical 16:
  circle w8: c-825,825 r25
  lines w6: -15.32,-53.43 74.69,-53.43 74.69,-8.43 84.69,-8.43 cw(c84.69,-18.43) 94.69,-18.43 94.69,-53.43 129.69,-53.43 139.69,-33.43 179.69,-33.43 189.69,-53.43 209.69,-53.43 169.69,51.57 149.69,51.57 119.69,-18.43 ; 119.68,-23.43 ccw(c102.19,-19.67) 109.69,-3.43 ccw(c92.19,21.34) 94.69,51.57 9.69,51.57 ; -75.32,31.57 -75.32,51.57 ; -75.32,31.57 -75.32,-33.43 -40.32,-33.43 -40.32,31.57 -75.32,31.57 ; -75.32,51.57 -95.32,51.57 -95.32,-33.43 -130.32,51.57 -150.32,51.57 -190.32,-53.43 -170.32,-53.43 -160.32,-33.43 -120.32,-33.43 -110.32,-53.43 -20.32,-53.43 -20.32,31.57 9.69,31.57 ; -75.32,51.57 9.69,51.57 ; 9.69,31.57 9.69,51.57 ; 9.69,31.57 9.69,11.57 49.69,11.57 49.69,31.57 9.69,31.57 ; -155.32,-13.43 -140.32,31.57 -125.32,-13.43 -155.32,-13.43 ; 9.69,-28.43 49.69,-28.43 49.69,-8.43 9.69,-8.43 9.69,-28.43 ; 74.69,11.57 74.69,31.57 89.69,31.57 cw(c89.69,21.57) 89.69,11.57 74.69,11.57 ; 144.69,-13.43 174.69,-13.43 159.69,31.57 144.69,-13.43
  text "BGA600" at -35.63,-453.74 h49.6

## BQFP100 [mil]
pads (100):
  rect 11.81x98.43 smd: 1(0,423.23) 2(-25,423.23) 3(-50,423.23) 4(-75,423.23) 5(-100,423.23) 6(-125,423.23) 7(-150,423.23) 8(-175,423.23) 9(-200,423.23) 10(-225,423.23) 11(-250,423.23) 12(-275,423.23) 13(-300,423.23) 39(-300,-423.23) 40(-275,-423.23) 41(-250,-423.23) 42(-225,-423.23) 43(-200,-423.23) 44(-175,-423.23) 45(-150,-423.23) 46(-125,-423.23) 47(-100,-423.23) 48(-75,-423.23) 49(-50,-423.23) 50(-25,-423.23) 51(0,-423.23) 52(25,-423.23) 53(50,-423.23) 54(75,-423.23) 55(100,-423.23) 56(125,-423.23) 57(150,-423.23) 58(175,-423.23) 59(200,-423.23) 60(225,-423.23) 61(250,-423.23) 62(275,-423.23) 63(300,-423.23) 89(300,423.23) 90(275,423.23) 91(250,423.23) 92(225,423.23) 93(200,423.23) 94(175,423.23) 95(150,423.23) 96(125,423.23) 97(100,423.23) 98(75,423.23) 99(50,423.23) 100(25,423.23)
  rect 98.43x11.81 smd: 14(-423.23,300) 15(-423.23,275) 16(-423.23,250) 17(-423.23,225) 18(-423.23,200) 19(-423.23,175) 20(-423.23,150) 21(-423.23,125) 22(-423.23,100) 23(-423.23,75) 24(-423.23,50) 25(-423.23,25) 26(-423.23,0) 27(-423.23,-25) 28(-423.23,-50) 29(-423.23,-75) 30(-423.23,-100) 31(-423.23,-125) 32(-423.23,-150) 33(-423.23,-175) 34(-423.23,-200) 35(-423.23,-225) 36(-423.23,-250) 37(-423.23,-275) 38(-423.23,-300) 64(423.23,-300) 65(423.23,-275) 66(423.23,-250) 67(423.23,-225) 68(423.23,-200) 69(423.23,-175) 70(423.23,-150) 71(423.23,-125) 72(423.23,-100) 73(423.23,-75) 74(423.23,-50) 75(423.23,-25) 76(423.23,0) 77(423.23,25) 78(423.23,50) 79(423.23,75) 80(423.23,100) 81(423.23,125) 82(423.23,150) 83(423.23,175) 84(423.23,200) 85(423.23,225) 86(423.23,250) 87(423.23,275) 88(423.23,300)
Top Overlay:
  circle w6: c0,275.59 r39.37
  lines w2: -361.14,-338.58 -440.94,-389.76 -440.94,-413.39 -413.39,-440.94 -389.76,-440.94 -338.58,-361.14 338.58,-361.14 385.83,-440.94 413.39,-440.94 440.94,-413.39 440.94,-389.76 361.14,-338.58 361.14,338.58 440.94,389.76 440.94,413.39 413.39,440.94 389.76,440.94 338.58,361.14 295.28,361.14 ; -361.14,338.58 -440.94,389.76 -440.94,413.39 -413.39,440.94 -389.76,440.94 -338.58,361.14 -295.28,361.14
  lines w6: -361.14,-338.58 -361.14,338.58 ; -295.28,369.02 -334.65,369.02 -385.83,448.82 -417.32,448.82 -448.82,417.32 -448.82,385.83 -369.02,334.65 -369.02,-334.65 -448.82,-385.83 -448.82,-417.32 -417.32,-448.82 -385.83,-448.82 -334.65,-369.02 334.65,-369.02 381.89,-448.82 417.32,-448.82 448.82,-417.32 448.82,-385.83 369.02,-334.65 369.02,334.65 448.82,385.83 448.82,417.32 417.32,448.82 385.83,448.82 334.65,369.02 295.28,369.02 ; -295.28,369.02 295.28,369.02 ; -295.28,369.02 -295.28,361.14 -295.28,329.65 295.28,329.65 295.28,361.14 295.28,369.02
Mechanical 16:
  rectangle: 294.09,369.02 305.91,445
  rectangle: 269.09,369.02 280.91,445
  rectangle: 244.09,369.02 255.91,445
  rectangle: 219.09,369.02 230.91,445
  rectangle: 194.09,369.02 205.91,445
  rectangle: 169.09,369.02 180.91,445
  rectangle: 144.09,369.02 155.91,445
  rectangle: 119.09,369.02 130.91,445
  rectangle: 94.09,369.02 105.91,445
  rectangle: 69.09,369.02 80.91,445
  rectangle: 44.09,369.02 55.91,445
  rectangle: 19.09,369.02 30.91,445
  rectangle: -5.91,369.02 5.91,445
  rectangle: -30.91,369.02 -19.09,445
  rectangle: -55.91,369.02 -44.09,445
  rectangle: -80.91,369.02 -69.09,445
  rectangle: -105.91,369.02 -94.09,445
  rectangle: -130.91,369.02 -119.09,445
  rectangle: -155.91,369.02 -144.09,445
  rectangle: -180.91,369.02 -169.09,445
  rectangle: -205.91,369.02 -194.09,445
  rectangle: -230.91,369.02 -219.09,445
  rectangle: -255.91,369.02 -244.09,445
  rectangle: -280.91,369.02 -269.09,445
  rectangle: -305.91,369.02 -294.09,445
  rectangle: -445,294.09 -369.02,305.91
  rectangle: -445,269.09 -369.02,280.91
  rectangle: -445,244.09 -369.02,255.91
  rectangle: -445,219.09 -369.02,230.91
  rectangle: -445,194.09 -369.02,205.91
  rectangle: -445,169.09 -369.02,180.91
  rectangle: -445,144.09 -369.02,155.91
  rectangle: -445,119.09 -369.02,130.91
  rectangle: -445,94.09 -369.02,105.91
  rectangle: -445,69.09 -369.02,80.91
  rectangle: -445,44.09 -369.02,55.91
  rectangle: -445,19.09 -369.02,30.91
  rectangle: -445,-5.91 -369.02,5.91
  rectangle: -445,-30.91 -369.02,-19.09
  rectangle: -445,-55.91 -369.02,-44.09
  rectangle: -445,-80.91 -369.02,-69.09
  rectangle: -445,-105.91 -369.02,-94.09
  rectangle: -445,-130.91 -369.02,-119.09
  rectangle: -445,-155.91 -369.02,-144.09
  rectangle: -445,-180.91 -369.02,-169.09
  rectangle: -445,-205.91 -369.02,-194.09
  rectangle: -445,-230.91 -369.02,-219.09
  rectangle: -445,-255.91 -369.02,-244.09
  rectangle: -445,-280.91 -369.02,-269.09
  rectangle: -445,-305.91 -369.02,-294.09
  rectangle: -305.91,-445 -294.09,-369.02
  rectangle: -280.91,-445 -269.09,-369.02
  rectangle: -255.91,-445 -244.09,-369.02
  rectangle: -230.91,-445 -219.09,-369.02
  rectangle: -205.91,-445 -194.09,-369.02
  rectangle: -180.91,-445 -169.09,-369.02
  rectangle: -155.91,-445 -144.09,-369.02
  rectangle: -130.91,-445 -119.09,-369.02
  rectangle: -105.91,-445 -94.09,-369.02
  rectangle: -80.91,-445 -69.09,-369.02
  rectangle: -55.91,-445 -44.09,-369.02
  rectangle: -30.91,-445 -19.09,-369.02
  rectangle: -5.91,-445 5.91,-369.02
  rectangle: 19.09,-445 30.91,-369.02
  rectangle: 44.09,-445 55.91,-369.02
  rectangle: 69.09,-445 80.91,-369.02
  rectangle: 94.09,-445 105.91,-369.02
  rectangle: 119.09,-445 130.91,-369.02
  rectangle: 144.09,-445 155.91,-369.02
  rectangle: 169.09,-445 180.91,-369.02
  rectangle: 194.09,-445 205.91,-369.02
  rectangle: 219.09,-445 230.91,-369.02
  rectangle: 244.09,-445 255.91,-369.02
  rectangle: 269.09,-445 280.91,-369.02
  rectangle: 294.09,-445 305.91,-369.02
  rectangle: 369.02,-305.91 445,-294.09
  rectangle: 369.02,-280.91 445,-269.09
  rectangle: 369.02,-255.91 445,-244.09
  rectangle: 369.02,-230.91 445,-219.09
  rectangle: 369.02,-205.91 445,-194.09
  rectangle: 369.02,-180.91 445,-169.09
  rectangle: 369.02,-155.91 445,-144.09
  rectangle: 369.02,-130.91 445,-119.09
  rectangle: 369.02,-105.91 445,-94.09
  rectangle: 369.02,-80.91 445,-69.09
  rectangle: 369.02,-55.91 445,-44.09
  rectangle: 369.02,-30.91 445,-19.09
  rectangle: 369.02,-5.91 445,5.91
  rectangle: 369.02,19.09 445,30.91
  rectangle: 369.02,44.09 445,55.91
  rectangle: 369.02,69.09 445,80.91
  rectangle: 369.02,94.09 445,105.91
  rectangle: 369.02,119.09 445,130.91
  rectangle: 369.02,144.09 445,155.91
  rectangle: 369.02,169.09 445,180.91
  rectangle: 369.02,194.09 445,205.91
  rectangle: 369.02,219.09 445,230.91
  rectangle: 369.02,244.09 445,255.91
  rectangle: 369.02,269.09 445,280.91
  rectangle: 369.02,294.09 445,305.91

## BR210S [mil]
pads (2):
  oval 60x120 hole 40: T1(-100,-100) T2(100,-100)
Top Overlay:
  circle w0: c-177,-146 r10
  rectangle: -210,-30 210,0
  rectangle: -210,-50 -135,-30
  rectangle: 135,-50 210,-30
  rectangle: -65,-50 65,-30
  lines w6: -200,-45 -195,-160 -185,-170 185,-170 195,-160 200,-45
Mechanical 16:
  rectangle: -135,-50 -65,-30
  rectangle: 65,-50 135,-30

## BR220S [mil]
pads (3):
  oval 60x120 hole 40: T1(-100,-100) T2(0,-100) T3(100,-100)
Top Overlay:
  circle w0: c-177,-146 r10
  rectangle: -210,-30 210,0
  rectangle: -210,-50 -135,-30
  rectangle: -65,-50 -35,-30
  rectangle: 35,-50 65,-30
  rectangle: 135,-50 210,-30
  lines w6: -200,-45 -195,-160 -185,-170 185,-170 195,-160 200,-45
Mechanical 16:
  rectangle: -135,-50 -65,-30
  rectangle: -35,-50 35,-30
  rectangle: 65,-50 135,-30

## C025-024X044 [mil]
pads (2):
  oct 48x48 hole 32: 1(-50,0) 2(50,0)
Top Overlay:
  lines w6: -85,-25 -85,25 cw(c-65,25) -65,45 65,45 cw(c65,25) 85,25 85,-25 cw(c65,-25) 65,-45 -65,-45 cw(c-65,-25) -85,-25
  lines w12: -12,-30 -12,30 ; 13,-30 13,30
Mechanical 16:
  lines w6: -50,0 -12,0 ; 13,0 50,0

## C025-025X050 [mil]
pads (2):
  oct 48x48 hole 32: 1(-50,0) 2(50,0)
Top Overlay:
  lines w6: -15,0 -10,0 ; 10,0 15,0 ; -95,-40 -95,40 cw(c-85,40) -85,50 85,50 cw(c85,40) 95,40 95,-40 cw(c85,-40) 85,-50 -85,-50 cw(c-85,-40) -95,-40
  lines w10: -10,-30 -10,0 -10,30 ; 10,-30 10,0 10,30
Mechanical 16:
  lines w6: -30,0 -15,0 ; 15,0 30,0

## C025-030X050 [mil]
pads (2):
  oct 48x48 hole 32: 1(-50,0) 2(50,0)
Top Overlay:
  lines w6: -15,0 -10,0 ; 10,0 15,0 ; -95,-50 -95,50 cw(c-85,50) -85,60 85,60 cw(c85,50) 95,50 95,-50 cw(c85,-50) 85,-60 -85,-60 cw(c-85,-50) -95,-50
  lines w10: -10,-30 -10,0 -10,30 ; 10,-30 10,0 10,30
Mechanical 16:
  lines w6: -30,0 -15,0 ; 15,0 30,0

## C025-040X050 [mil]
pads (2):
  oct 48x48 hole 32: 1(-50,0) 2(50,0)
Top Overlay:
  lines w6: -15,0 -10,0 ; 10,0 15,0 ; -95,-65 -95,65 cw(c-85,65) -85,75 85,75 cw(c85,65) 95,65 95,-65 cw(c85,-65) 85,-75 -85,-75 cw(c-85,-65) -95,-65
  lines w10: -10,-30 -10,0 -10,30 ; 10,-30 10,0 10,30
Mechanical 16:
  lines w6: -30,0 -15,0 ; 15,0 30,0

## C025-050X050 [mil]
pads (2):
  oct 48x48 hole 32: 1(-50,0) 2(50,0)
Top Overlay:
  lines w6: -15,0 -10,0 ; 10,0 15,0 ; -95,-80 -95,80 cw(c-85,80) -85,90 85,90 cw(c85,80) 95,80 95,-80 cw(c85,-80) 85,-90 -85,-90 cw(c-85,-80) -95,-80
  lines w10: -10,-30 -10,0 -10,30 ; 10,-30 10,0 10,30
Mechanical 16:
  lines w6: -30,0 -15,0 ; 15,0 30,0